# Altium footprint library CONN_HDR_MINI_ST.PcbLib: 116 footprints (part 1 of 10)
Each footprint in its own frame and in the unit in brackets; x right, y up, seen from the top. Pads: shape width x height; smd on the part's side, far side on the other; paste and mask are expansions set on the pad; w line width, h text height; cw(c..) or ccw(c..) is an arc to the next point about the centre after c.
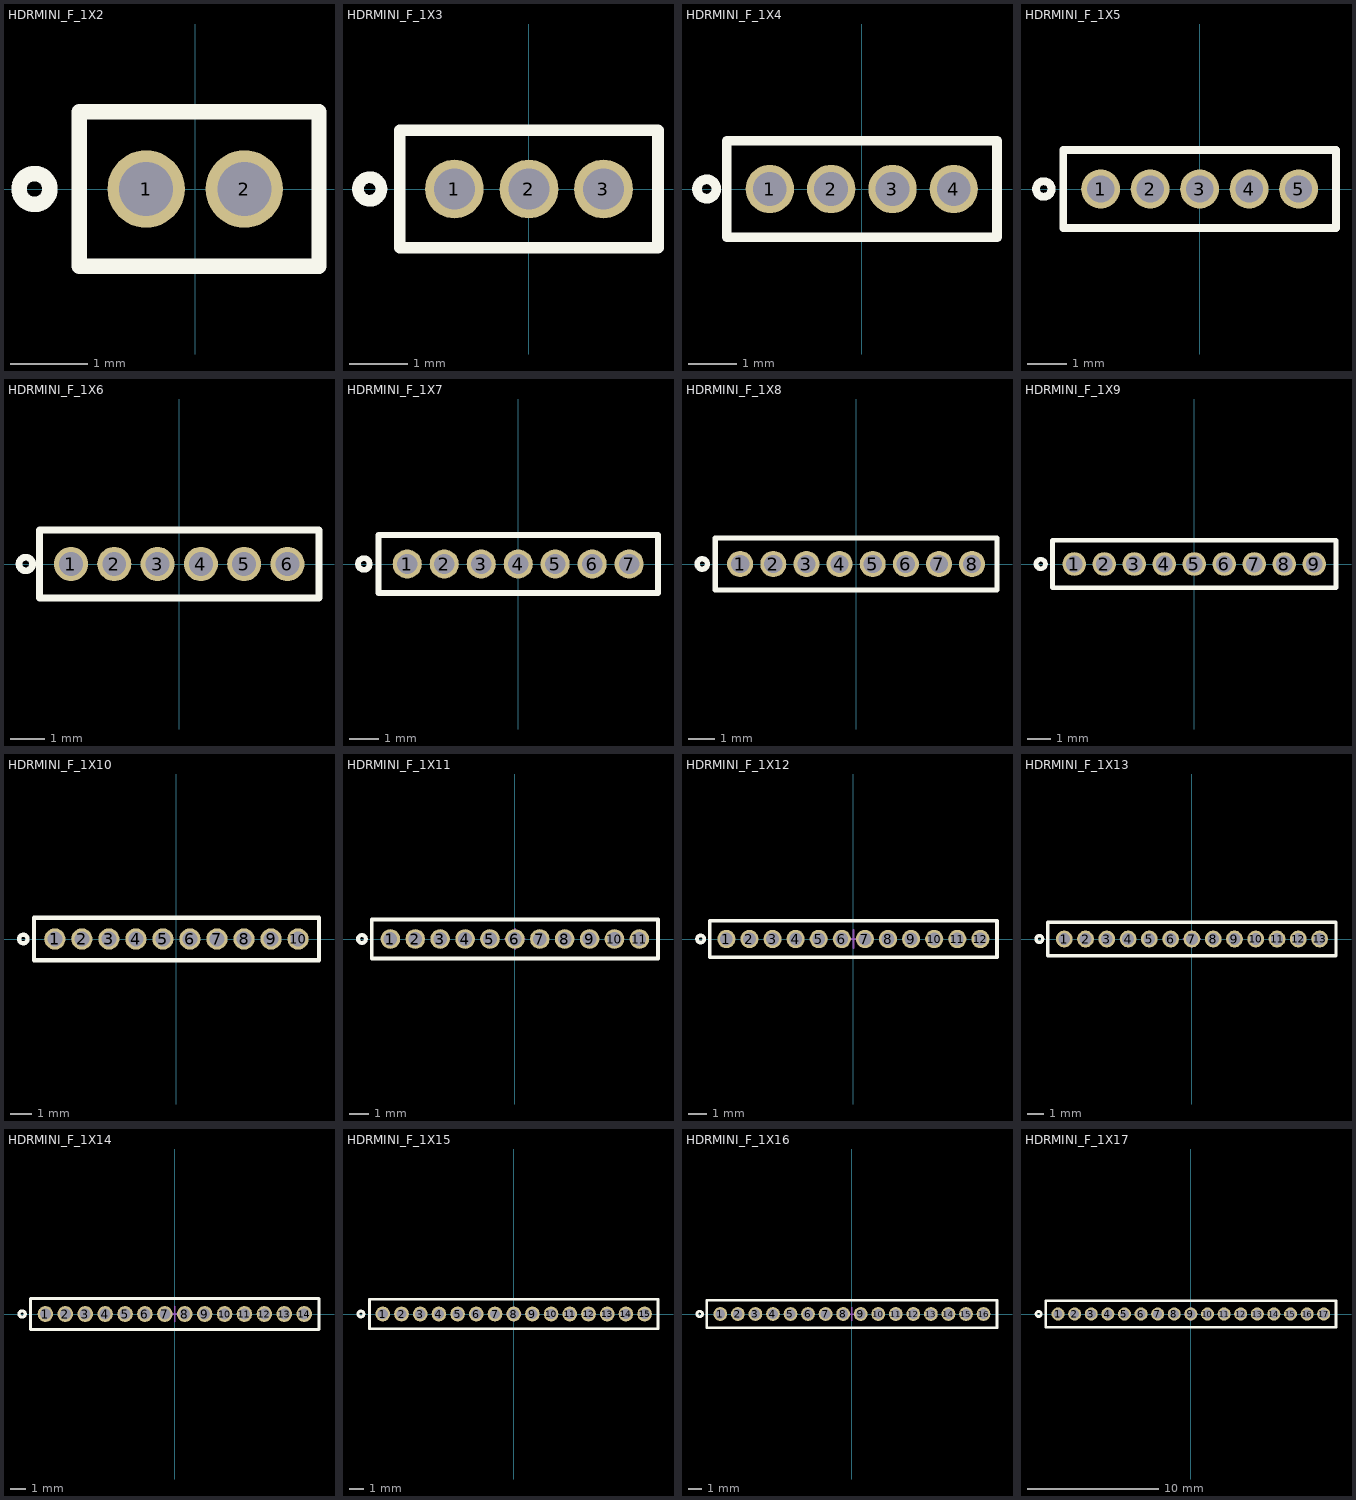
[diagram p0: the footprints below, top view; thin cyan lines are the x and y axes]

## HDRMINI_F_1X2 [mm] "mini header (50mil pitch)"
pads (2):
  round 1 / inner round 1 / far side oval 1x1.4 hole 0.7 mask+0.05: 1(-0.635,0) 2(0.635,0)
Top Overlay:
  circle w0.2: c-2.078,0 r0.2
  lines w0.2: -1.5,-1 1.6,-1 1.6,1 -1.5,1 -1.5,-1
3D body "female_header_a-bl127-eg-g03d.stp": height 3.45, standoff -2.35, extent -1.47,-0.9 2.74,0.9

## HDRMINI_F_1X3 [mm] "mini header (50mil pitch)"
pads (3):
  round 1 / inner round 1 / far side oval 1x1.4 hole 0.7 mask+0.05: 1(-1.27,0) 2(0,0) 3(1.27,0)
Top Overlay:
  circle w0.2: c-2.713,0 r0.2
  lines w0.2: -2.2,-1 -2.2,1 2.2,1 2.2,-1 -2.2,-1
3D body "female_header_a-bl127-eg-g03d.stp": height 3.45, standoff -2.35, extent -2.105,-0.9 2.105,0.9

## HDRMINI_F_1X4 [mm] "mini header (50mil pitch)"
pads (4):
  round 1 / inner round 1 / far side oval 1x1.4 hole 0.7 mask+0.05: 1(-1.905,0) 2(-0.635,0) 3(0.635,0) 4(1.905,0)
Top Overlay:
  circle w0.2: c-3.213,0 r0.2
  lines w0.2: -2.8,-1 2.8,-1 2.8,1 -2.8,1 -2.8,-1
3D body "female_header_a-bl127-eg-g04d.stp": height 3.45, standoff -2.35, extent -2.74,-0.9 2.74,0.9

## HDRMINI_F_1X5 [mm] "mini header (50mil pitch)"
pads (5):
  round 1 / inner round 1 / far side oval 1x1.4 hole 0.7 mask+0.05: 1(-2.54,0) 2(-1.27,0) 3(0,0) 4(1.27,0) 5(2.54,0)
Top Overlay:
  circle w0.2: c-4,0 r0.2
  lines w0.2: -3.5,-1 3.5,-1 3.5,1 -3.5,1 -3.5,-1
3D body "female_header_a-bl127-eg-g05d.stp": height 3.45, standoff -2.35, extent -3.375,-0.9 3.375,0.9

## HDRMINI_F_1X6 [mm] "mini header (50mil pitch)"
pads (6):
  round 1 / inner round 1 / far side oval 1x1.4 hole 0.7 mask+0.05: 1(-3.175,0) 2(-1.905,0) 3(-0.635,0) 4(0.635,0) 5(1.905,0) 6(3.175,0)
Top Overlay:
  circle w0.2: c-4.5,0 r0.2
  lines w0.2: -4.1,-1 4.1,-1 4.1,1 -4.1,1 -4.1,-1
3D body "female_header_a-bl127-eg-g06d.stp": height 3.45, standoff -2.35, extent -4.01,-0.9 4.01,0.9

## HDRMINI_F_1X7 [mm] "mini header (50mil pitch)"
pads (7):
  round 1 / inner round 1 / far side oval 1x1.4 hole 0.7 mask+0.05: 1(-3.81,0) 2(-2.54,0) 3(-1.27,0) 4(0,0) 5(1.27,0) 6(2.54,0) 7(3.81,0)
Top Overlay:
  circle w0.2: c-5.3,0 r0.2
  lines w0.2: -4.8,-1 4.8,-1 4.8,1 -4.8,1 -4.8,-1
3D body "female_header_a-bl127-eg-g07d.stp": height 3.45, standoff -2.35, extent -4.645,-0.9 4.645,0.9

## HDRMINI_F_1X8 [mm] "mini header (50mil pitch)"
pads (8):
  round 1 / inner round 1 / far side oval 1x1.4 hole 0.7 mask+0.05: 1(-4.445,0) 2(-3.175,0) 3(-1.905,0) 4(-0.635,0) 5(0.635,0) 6(1.905,0) 7(3.175,0) 8(4.445,0)
Top Overlay:
  circle w0.2: c-5.9,0 r0.2
  lines w0.2: -5.4,-1 5.4,-1 5.4,1 -5.4,1 -5.4,-1
3D body "female_header_a-bl127-eg-g08d.stp": height 3.45, standoff -2.35, extent -5.28,-0.9 5.28,0.9

## HDRMINI_F_1X9 [mm] "mini header (50mil pitch)"
pads (9):
  round 1 / inner round 1 / far side oval 1x1.4 hole 0.7 mask+0.05: 1(-5.08,0) 2(-3.81,0) 3(-2.54,0) 4(-1.27,0) 5(0,0) 6(1.27,0) 7(2.54,0) 8(3.81,0) 9(5.08,0)
Top Overlay:
  circle w0.2: c-6.5,0 r0.2
  lines w0.2: -6,-1 6,-1 6,1 -6,1 -6,-1
3D body "female_header_a-bl127-eg-g09d.stp": height 3.45, standoff -2.35, extent -5.915,-0.9 5.915,0.9

## HDRMINI_F_1X10 [mm] "mini header (50mil pitch)"
pads (10):
  round 1 / inner round 1 / far side oval 1x1.4 hole 0.7 mask+0.05: 1(-5.715,0) 2(-4.445,0) 3(-3.175,0) 4(-1.905,0) 5(-0.635,0) 6(0.635,0) 7(1.905,0) 8(3.175,0) 9(4.445,0) 10(5.715,0)
Top Overlay:
  circle w0.2: c-7.2,0 r0.2
  lines w0.2: -6.7,-1 -6.7,1 6.7,1 6.7,-1 -6.7,-1
3D body "female_header_a-bl127-eg-g10d.stp": height 3.45, standoff -2.35, extent -6.55,-0.9 6.55,0.9

## HDRMINI_F_1X11 [mm] "mini header (50mil pitch)"
pads (11):
  round 1 / inner round 1 / far side oval 1x1.4 hole 0.7 mask+0.05: 1(-6.35,0) 2(-5.08,0) 3(-3.81,0) 4(-2.54,0) 5(-1.27,0) 6(0,0) 7(1.27,0) 8(2.54,0) 9(3.81,0) 10(5.08,0) 11(6.35,0)
Top Overlay:
  circle w0.2: c-7.8,0 r0.2
  lines w0.2: -7.3,-1 -7.3,1 7.3,1 7.3,-1 -7.3,-1
Mechanical 1:
  lines w0.1: -0.5,0 0.5,0 ; 0,-0.5 0,0.5
3D body "female_header_a-bl127-eg-g11d.stp": height 3.45, standoff -2.35, extent -7.185,-0.9 7.185,0.9

## HDRMINI_F_1X12 [mm] "mini header (50mil pitch)"
pads (12):
  round 1 / inner round 1 / far side oval 1x1.4 hole 0.7 mask+0.05: 1(-6.985,0) 2(-5.715,0) 3(-4.445,0) 4(-3.175,0) 5(-1.905,0) 6(-0.635,0) 7(0.635,0) 8(1.905,0) 9(3.175,0) 10(4.445,0) 11(5.715,0) 12(6.985,0)
Top Overlay:
  circle w0.2: c-8.4,0 r0.2
  lines w0.2: -7.9,-1 7.9,-1 7.9,1 -7.9,1 -7.9,-1
Mechanical 1:
  lines w0.1: -0.5,0 0.5,0 ; 0,-0.5 0,0.5
3D body "female_header_a-bl127-eg-g12d.stp": height 3.45, standoff -2.35, extent -7.82,-0.9 7.82,0.9

## HDRMINI_F_1X13 [mm] "mini header (50mil pitch)"
pads (13):
  round 1 / inner round 1 / far side oval 1x1.4 hole 0.7 mask+0.05: 1(-7.62,0) 2(-6.35,0) 3(-5.08,0) 4(-3.81,0) 5(-2.54,0) 6(-1.27,0) 7(0,0) 8(1.27,0) 9(2.54,0) 10(3.81,0) 11(5.08,0) 12(6.35,0) 13(7.62,0)
Top Overlay:
  circle w0.2: c-9.105,0 r0.2
  lines w0.2: -8.605,-1 -8.605,1 8.6,1 8.6,-1 -8.605,-1
Mechanical 1:
  lines w0.1: -0.5,0 0.5,0 ; 0,-0.5 0,0.5
3D body "female_header_a-bl127-eg-g13d.stp": height 3.45, standoff -2.35, extent -8.455,-0.9 8.455,0.9

## HDRMINI_F_1X14 [mm] "mini header (50mil pitch)"
pads (14):
  round 1 / inner round 1 / far side oval 1x1.4 hole 0.7 mask+0.05: 1(-8.255,0) 2(-6.985,0) 3(-5.715,0) 4(-4.445,0) 5(-3.175,0) 6(-1.905,0) 7(-0.635,0) 8(0.635,0) 9(1.905,0) 10(3.175,0) 11(4.445,0) 12(5.715,0) 13(6.985,0) 14(8.255,0)
Top Overlay:
  circle w0.2: c-9.74,0 r0.2
  lines w0.2: -9.2,-1 -9.2,1 9.2,1 9.2,-1 -9.2,-1
Mechanical 1:
  lines w0.1: -0.5,0 0.5,0 ; 0,-0.5 0,0.5
3D body "female_header_a-bl127-eg-g14d.stp": height 3.45, standoff -2.35, extent -9.09,-0.9 9.09,0.9

## HDRMINI_F_1X15 [mm] "mini header (50mil pitch)"
pads (15):
  round 1 / inner round 1 / far side oval 1x1.4 hole 0.7 mask+0.05: 1(-8.89,0) 2(-7.62,0) 3(-6.35,0) 4(-5.08,0) 5(-3.81,0) 6(-2.54,0) 7(-1.27,0) 8(0,0) 9(1.27,0) 10(2.54,0) 11(3.81,0) 12(5.08,0) 13(6.35,0) 14(7.62,0) 15(8.89,0)
Top Overlay:
  circle w0.2: c-10.375,0 r0.2
  lines w0.2: -9.8,-1 -9.8,1 9.8,1 9.8,-1 -9.8,-1
Mechanical 1:
  lines w0.1: -0.5,0 0.5,0 ; 0,-0.5 0,0.5
3D body "female_header_a-bl127-eg-g15d.stp": height 3.45, standoff -2.35, extent -9.725,-0.9 9.725,0.9

## HDRMINI_F_1X16 [mm] "mini header (50mil pitch)"
pads (16):
  round 1 / inner round 1 / far side oval 1x1.4 hole 0.7 mask+0.05: 1(-9.525,0) 2(-8.255,0) 3(-6.985,0) 4(-5.715,0) 5(-4.445,0) 6(-3.175,0) 7(-1.905,0) 8(-0.635,0) 9(0.635,0) 10(1.905,0) 11(3.175,0) 12(4.445,0) 13(5.715,0) 14(6.985,0) 15(8.255,0) 16(9.525,0)
Top Overlay:
  circle w0.2: c-11.01,0 r0.2
  lines w0.2: -10.51,-1 10.5,-1 10.5,1 -10.51,1 -10.51,-1
Mechanical 1:
  lines w0.1: -0.5,0 0.5,0 ; 0,-0.5 0,0.5
3D body "female_header_a-bl127-eg-g16d.stp": height 3.45, standoff -2.35, extent -10.36,-0.9 10.36,0.9

## HDRMINI_F_1X17 [mm] "mini header (50mil pitch)"
pads (17):
  round 1 / inner round 1 / far side oval 1x1.4 hole 0.7 mask+0.05: 1(-10.16,0) 2(-8.89,0) 3(-7.62,0) 4(-6.35,0) 5(-5.08,0) 6(-3.81,0) 7(-2.54,0) 8(-1.27,0) 9(0,0) 10(1.27,0) 11(2.54,0) 12(3.81,0) 13(5.08,0) 14(6.35,0) 15(7.62,0) 16(8.89,0) 17(10.16,0)
Top Overlay:
  circle w0.2: c-11.645,0 r0.2
  lines w0.2: -11.1,-1 -11.1,1 11.1,1 11.1,-1 -11.1,-1
Mechanical 1:
  lines w0.1: -0.5,0 0.5,0 ; 0,-0.5 0,0.5
3D body "female_header_a-bl127-eg-g17d.stp": height 3.45, standoff -2.35, extent -10.995,-0.9 10.995,0.9